# Altium footprint library 430 integreted.PcbLib: 281 footprints (part 16 of 18)
Each footprint in its own frame and in the unit in brackets; x right, y up, seen from the top. Pads: shape width x height; smd on the part's side, far side on the other; paste and mask are expansions set on the pad; w line width, h text height; cw(c..) or ccw(c..) is an arc to the next point about the centre after c.
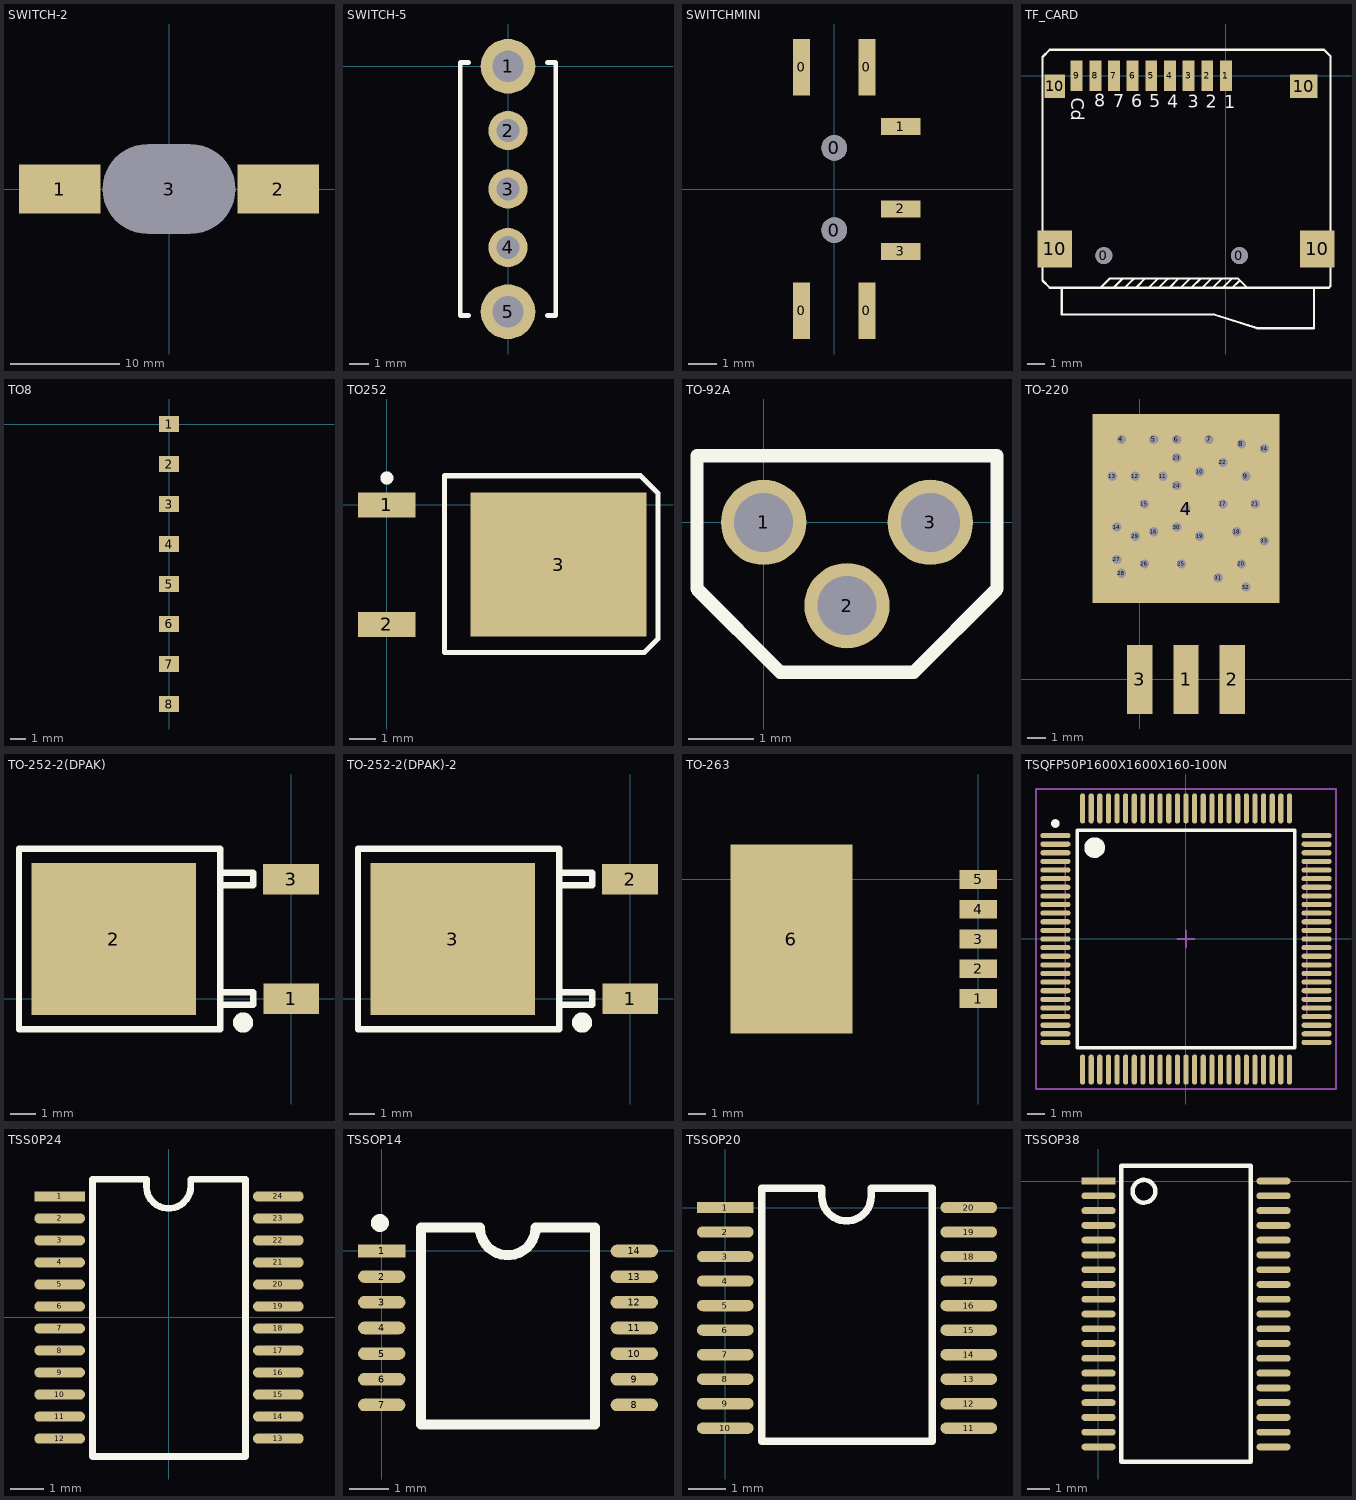
[diagram p15: the footprints below, top view; thin cyan lines are the x and y axes]

## SWITCH-2 [mm]
pads (3):
  rect 7.5x4.5 smd: 1(-10.033,0) 2(10.033,0)
  oval 12.15x8.2 hole 8.2 slot 12.15 at 0 deg: 3(0,0)

## SWITCH-5 [mm]
pads (5):
  round 2.8 hole 1.6: 1(0,0) 5(0,-12.6)
  round 2 hole 1.2: 2(0,-3.3) 3(0,-6.3) 4(0,-9.3)
Top Overlay:
  lines w0.254: -2.032,-12.8 -2.45,-12.8 -2.45,0.2 -2.032,0.2 ; 2.032,-12.8 2.45,-12.8 2.45,0.2 2.032,0.2

## SWITCHMINI [mm]
pads (9):
  rect 0.6x2 smd: 0(-1.15,-4.3) 0(-1.15,4.3) 0(1.15,-4.3) 0(1.15,4.3)
  round 0.9 hole 0.9: 0(0,-1.45) 0(0,1.45)
  rect 1.4x0.6 smd: 1(2.35,2.2) 2(2.35,-0.7) 3(2.35,-2.2)

## TF_CARD [mm]
pads (15):
  round 1 hole 1 unplated: 0(-7.2,-10.627) 0(0.8,-10.627)
  rect 0.7x1.8 smd: 1(0,0) 2(-1.1,0) 3(-2.2,0) 4(-3.3,0) 5(-4.4,0) 6(-5.5,0) 7(-6.6,0) 8(-7.7,0) 9(-8.8,0)
  rect 2.032x2.2 smd: 10(-10.1,-10.227) 10(5.4,-10.227)
  rect 1.2x1.4 smd: 10(-10.1,-0.627)
  rect 1.6x1.4 smd: 10(4.6,-0.627)
Top Overlay:
  lines w0.127: -9.677,-12.522 -9.677,-14.097 -0.686,-14.097 ; -6.629,-12.522 -6.096,-11.989 -6.096,-11.963 ; -5.969,-12.522 -5.461,-12.014 -5.461,-11.963 ; -5.232,-12.522 -5.232,-12.446 -4.75,-11.963 ; -4.547,-12.522 -3.988,-11.963 -3.962,-11.963 ; -3.962,-12.522 -3.429,-11.989 -3.429,-11.963 ; -3.327,-12.522 -2.769,-11.963 -2.667,-11.963 ; -2.667,-12.522 -2.108,-11.963 -2.083,-11.963 ; -2.032,-12.522 -1.499,-11.989 -1.499,-11.963 ; -1.397,-12.522 -0.838,-11.963 -0.711,-11.963 ; -0.762,-12.522 -0.203,-11.963 -0.178,-11.963 ; -0.711,-14.097 1.854,-14.91 5.207,-14.91 5.207,-12.548 ; -0.178,-12.522 0.381,-11.963 ; 0.381,-12.522 0.787,-12.116 0.864,-12.116 ; -10.389,-12.522 -7.391,-12.522 -6.833,-11.963 0.711,-11.963 1.27,-12.522 6.071,-12.522 ; -10.389,-12.522 6.071,-12.522 ; -10.389,-12.522 -10.82,-12.09 -10.82,1.092 -10.389,1.524 5.791,1.524 6.172,1.143 6.172,-12.421 6.071,-12.522
  text "1" at -0.102,-1.93 h0.76
  text "2" at -1.194,-1.905 h0.76
  text "3" at -2.261,-1.905 h0.76
  text "4" at -3.454,-1.905 h0.76
  text "5" at -4.521,-1.88 h0.76
  text "6" at -5.588,-1.88 h0.76
  text "7" at -6.655,-1.88 h0.76
  text "8" at -7.772,-1.854 h0.76
  text "Cd" at -9.119,-1.295 h0.76
3D body: height 1.8, standoff -0.7, extent -10.372,-14.852 5.901,0.342

## TO8 [mm]
pads (8):
  rect 1.27x1 smd: 1(0,0) 2(0,-2.54) 3(0,-5.08) 4(0,-7.62) 5(0,-10.16) 6(0,-12.7) 7(0,-15.24) 8(0,-17.78)

## TO252 [mm]
pads (3):
  rect 2.2x0.95 smd: 1(0,0) 2(0,-4.56)
  rect 6.7x5.5 smd: 3(6.55,-2.28)
Top Overlay:
  circle w0.25: c0,1.025 r0.125
  lines w0.1: 2.2,-5.63 2.2,1.07
  lines w0.2: 2.2,-5.63 2.2,1.111 9.678,1.111 10.344,0.445 10.344,-5.104 9.818,-5.63 2.2,-5.63
3D body: height 2.31, standoff 0, extent -0.075,-5.58 9.175,1.02

## TO-92A [mm]
pads (3):
  round 1.3 hole 0.9: 1(0,0) 2(1.27,-1.27) 3(2.54,0)
Top Overlay:
  lines w0.203: -1.016,-1.016 0.254,-2.286 2.286,-2.286 3.556,-1.016 3.556,1.016 -1.016,1.016 -1.016,-1.016

## TO-220 [mil]
pads (35):
  rect 55x150 smd: 1(100,0) 2(200,0) 3(0,0)
  round 20 hole 20: 4(-40,520) 5(30,520) 6(80,520) 7(150,520) 8(220,510) 9(230,440) 10(130,450) 11(50,440) 12(-10,440) 13(-60,440) 14(-50,330) 15(10,380) 16(30,320) 17(180,380) 18(210,320) 19(130,310) 20(220,250) 21(250,380) 22(180,470) 23(80,480) 24(80,420) 25(90,250) 26(10,250) 27(-50,260) 28(-40,230) 29(-10,310) 30(80,330) 31(170,220) 32(230,200) 33(270,300) 34(270,500)
  rect 405x410 hole 20: 4(100,370)

## TO-252-2(DPAK) [mm]
pads (3):
  rect 2.2x1.2 smd: 1(0,0) 3(-0.004,4.723)
  rect 6.5x6 smd: 2(-7,2.361)
Top Overlay:
  circle w0.4: c-1.9,-0.939 r0.2
  lines w0.254: -2.804,4.484 -1.504,4.484 -1.504,4.984 -2.804,4.984 ; -2.8,-0.239 -1.5,-0.239 -1.5,0.261 -2.8,0.261 ; -10.75,-1.212 -2.8,-1.212 -2.8,5.934 -10.75,5.934 -10.75,-1.212
3D body: height 2.44, standoff 0.03, extent -9.738,-0.909 0.2,5.631

## TO-252-2(DPAK)-2 [mm]
pads (3):
  rect 2.2x1.2 smd: 1(0,0) 2(-0.004,4.723)
  rect 6.5x6 smd: 3(-7,2.361)
Top Overlay:
  circle w0.4: c-1.9,-0.939 r0.2
  lines w0.254: -2.804,4.484 -1.504,4.484 -1.504,4.984 -2.804,4.984 ; -2.8,-0.239 -1.5,-0.239 -1.5,0.261 -2.8,0.261 ; -10.75,-1.212 -2.8,-1.212 -2.8,5.934 -10.75,5.934 -10.75,-1.212
3D body: height 2.44, standoff 0.03, extent -9.738,-0.909 0.2,5.631

## TO-263 [mil]
pads (6):
  rect 85x42 smd: 1(0,-268) 2(0,-201) 3(0,-134) 4(0,-67) 5(0,0)
  rect 275x425 smd: 6(-420.5,-134)

## TSQFP50P1600X1600X160-100N [mm] "TSQFP, 100-Leads, Body 16.2x16.2mm (max), Pitch 0.50mm, IPC Medium Density"
height 1.6
pads (100):
  oval 1.75x0.3 smd: 1(-7.575,6) 2(-7.575,5.5) 3(-7.575,5) 4(-7.575,4.5) 5(-7.575,4) 6(-7.575,3.5) 7(-7.575,3) 8(-7.575,2.5) 9(-7.575,2) 10(-7.575,1.5) 11(-7.575,1) 12(-7.575,0.5) 13(-7.575,0) 14(-7.575,-0.5) 15(-7.575,-1) 16(-7.575,-1.5) 17(-7.575,-2) 18(-7.575,-2.5) 19(-7.575,-3) 20(-7.575,-3.5) 21(-7.575,-4) 22(-7.575,-4.5) 23(-7.575,-5) 24(-7.575,-5.5) 25(-7.575,-6) 51(7.575,-6) 52(7.575,-5.5) 53(7.575,-5) 54(7.575,-4.5) 55(7.575,-4) 56(7.575,-3.5) 57(7.575,-3) 58(7.575,-2.5) 59(7.575,-2) 60(7.575,-1.5) 61(7.575,-1) 62(7.575,-0.5) 63(7.575,0) 64(7.575,0.5) 65(7.575,1) 66(7.575,1.5) 67(7.575,2) 68(7.575,2.5) 69(7.575,3) 70(7.575,3.5) 71(7.575,4) 72(7.575,4.5) 73(7.575,5) 74(7.575,5.5) 75(7.575,6)
  oval 0.3x1.75 smd: 26(-6,-7.575) 27(-5.5,-7.575) 28(-5,-7.575) 29(-4.5,-7.575) 30(-4,-7.575) 31(-3.5,-7.575) 32(-3,-7.575) 33(-2.5,-7.575) 34(-2,-7.575) 35(-1.5,-7.575) 36(-1,-7.575) 37(-0.5,-7.575) 38(0,-7.575) 39(0.5,-7.575) 40(1,-7.575) 41(1.5,-7.575) 42(2,-7.575) 43(2.5,-7.575) 44(3,-7.575) 45(3.5,-7.575) 46(4,-7.575) 47(4.5,-7.575) 48(5,-7.575) 49(5.5,-7.575) 50(6,-7.575) 76(6,7.575) 77(5.5,7.575) 78(5,7.575) 79(4.5,7.575) 80(4,7.575) 81(3.5,7.575) 82(3,7.575) 83(2.5,7.575) 84(2,7.575) 85(1.5,7.575) 86(1,7.575) 87(0.5,7.575) 88(0,7.575) 89(-0.5,7.575) 90(-1,7.575) 91(-1.5,7.575) 92(-2,7.575) 93(-2.5,7.575) 94(-3,7.575) 95(-3.5,7.575) 96(-4,7.575) 97(-4.5,7.575) 98(-5,7.575) 99(-5.5,7.575) 100(-6,7.575)
Top Overlay:
  circle w0.25: c-7.575,6.7 r0.125
  circle w0.6: c-5.3,5.3 r0.3
  lines w0.2: -6.3,-6.3 -6.3,6.3 6.3,6.3 6.3,-6.3 -6.3,-6.3
Mechanical 13:
  lines w0.1: -7,-4.5 -7,4.5 ; 7,-4.5 7,4.5
Mechanical 15:
  lines w0.1: -0.5,0 0.5,0 ; 0,-0.5 0,0.5 ; -8.7,-8.7 -8.7,8.7 8.7,8.7 8.7,-8.7 -8.7,-8.7

## TSS0P24 [mm]
pads (24):
  rect 1.5x0.3 smd: 1(-3.227,3.575)
  oval 1.5x0.3 smd: 2(-3.227,2.925) 3(-3.227,2.275) 4(-3.227,1.625) 5(-3.227,0.975) 6(-3.227,0.325) 7(-3.227,-0.325) 8(-3.227,-0.975) 9(-3.227,-1.625) 10(-3.227,-2.275) 11(-3.227,-2.925) 12(-3.227,-3.575) 13(3.227,-3.575) 14(3.227,-2.925) 15(3.227,-2.275) 16(3.227,-1.625) 17(3.227,-0.975) 18(3.227,-0.325) 19(3.227,0.325) 20(3.227,0.975) 21(3.227,1.625) 22(3.227,2.275) 23(3.227,2.925) 24(3.227,3.575)
Top Overlay:
  lines w0.2: -2.262,-4.1 2.259,-4.1 2.259,4.083 0.643,4.083 0.643,3.875 cw(c-0.013,3.875) -0.668,3.875 -0.668,4.083 -2.262,4.083 -2.262,-4.1
3D body: height 1.2, standoff 0, extent -3.275,-3.3 3.275,3.3

## TSSOP14 [mm]
pads (14):
  rect 1.2x0.32 smd: 1(0,0)
  oval 1.2x0.32 smd: 2(0,-0.65) 3(0,-1.3) 4(0,-1.95) 5(0,-2.6) 6(0,-3.25) 7(0,-3.9) 8(6.4,-3.9) 9(6.4,-3.25) 10(6.4,-2.6) 11(6.4,-1.95) 12(6.4,-1.3) 13(6.4,-0.65) 14(6.4,0)
Top Overlay:
  lines w0.254: 0,0.8 ccw(c-0.045,0.711) 0.026,0.781 ; 1,-4.4 5.4,-4.4 5.4,0.6 3.9,0.6 cw(c3.194,0.6) 2.487,0.6 1,0.6 1,-4.4
3D body: height 1.2, standoff 0, extent 0.026,-4.506 6.426,0.594

## TSSOP20 [mm]
pads (20):
  rect 1.5x0.3 smd: 1(0,0)
  oval 1.5x0.3 smd: 2(0,-0.65) 3(0,-1.3) 4(0,-1.95) 5(0,-2.6) 6(0,-3.25) 7(0,-3.9) 8(0,-4.55) 9(0,-5.2) 10(0,-5.85) 11(6.454,-5.85) 12(6.454,-5.2) 13(6.454,-4.55) 14(6.454,-3.9) 15(6.454,-3.25) 16(6.454,-2.6) 17(6.454,-1.95) 18(6.454,-1.3) 19(6.454,-0.65) 20(6.454,0)
Top Overlay:
  lines w0.2: 0.965,-6.2 5.486,-6.2 5.486,0.508 3.87,0.508 3.87,0.3 cw(c3.214,0.3) 2.559,0.3 2.559,0.508 0.965,0.508 0.965,-6.2
3D body: height 1.2, standoff 0, extent -0.049,-6.221 6.501,0.379

## TSSOP38 [mm]
pads (38):
  rect 1.5x0.3 smd: 1(0,0)
  oval 1.5x0.3 smd: 2(0,-0.65) 3(0,-1.3) 4(0,-1.95) 5(0,-2.6) 6(0,-3.25) 7(0,-3.9) 8(0,-4.55) 9(0,-5.2) 10(0,-5.85) 11(0,-6.5) 12(0,-7.15) 13(0,-7.8) 14(0,-8.45) 15(0,-9.1) 16(0,-9.75) 17(0,-10.4) 18(0,-11.05) 19(0,-11.7) 20(7.7,-11.7) 21(7.7,-11.05) 22(7.7,-10.4) 23(7.7,-9.75) 24(7.7,-9.1) 25(7.7,-8.45) 26(7.7,-7.8) 27(7.7,-7.15) 28(7.7,-6.5) 29(7.7,-5.85) 30(7.7,-5.2) 31(7.7,-4.55) 32(7.7,-3.9) 33(7.7,-3.25) 34(7.7,-2.6) 35(7.7,-1.95) 36(7.7,-1.3) 37(7.7,-0.65) 38(7.7,0)
Top Overlay:
  circle w0.2: c2,-0.45 r0.5
  lines w0.2: 1,-12.35 1,0.675 6.7,0.675 6.7,-12.35 1,-12.35